# Altium footprint library STM32F0.PcbLib: 228 footprints (part 11 of 16)
Each footprint in its own frame and in the unit in brackets; x right, y up, seen from the top. Pads: shape width x height; smd on the part's side, far side on the other; paste and mask are expansions set on the pad; w line width, h text height; cw(c..) or ccw(c..) is an arc to the next point about the centre after c.
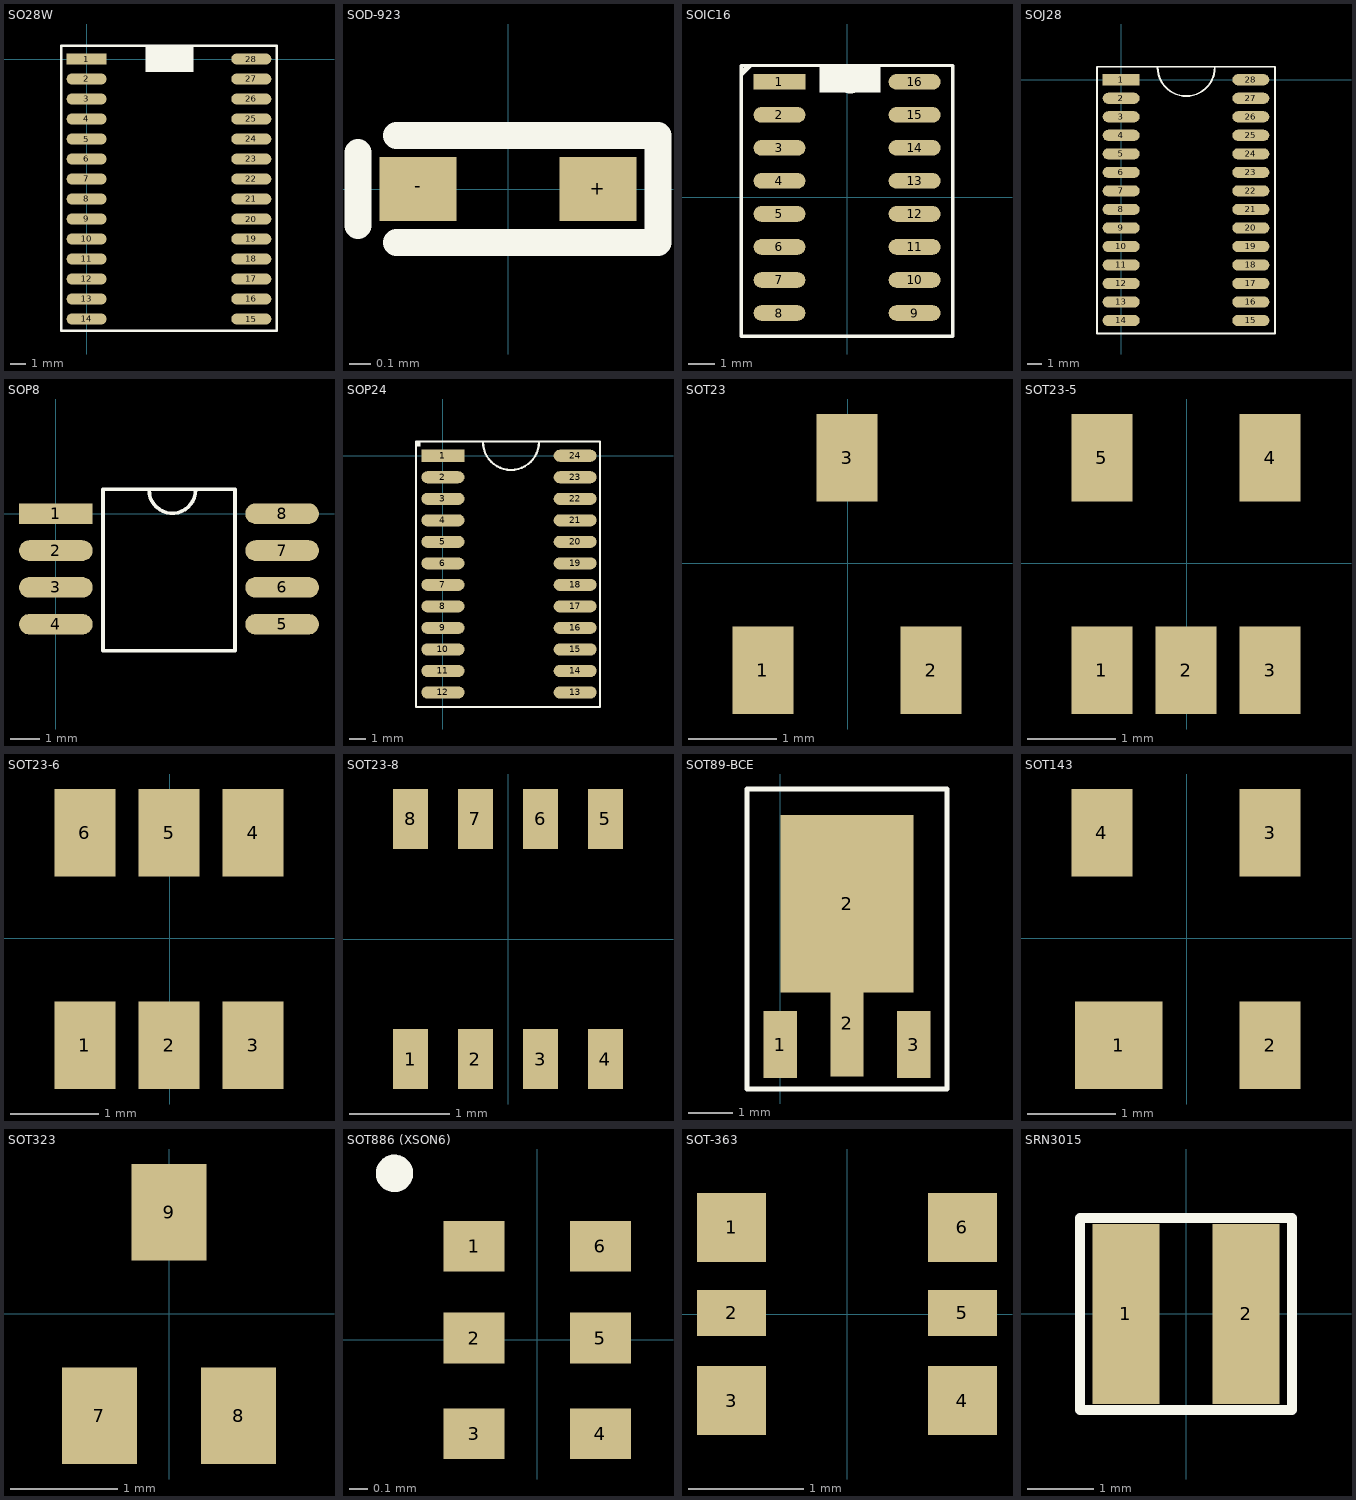
[diagram p10: the footprints below, top view; thin cyan lines are the x and y axes]

## SO28W [mil]
pads (28):
  rect 100x28 smd: 1(0,0)
  oval 100x28 smd: 2(0,-50) 3(0,-100) 4(0,-150) 5(0,-200) 6(0,-250) 7(0,-300) 8(0,-350) 9(0,-400) 10(0,-450) 11(0,-500) 12(0,-550) 13(0,-600) 14(0,-650) 15(411.81,-650) 16(411.81,-600) 17(411.81,-550) 18(411.81,-500) 19(411.81,-450) 20(411.81,-400) 21(411.81,-350) 22(411.81,-300) 23(411.81,-250) 24(411.81,-200) 25(411.81,-150) 26(411.81,-100) 27(411.81,-50) 28(411.81,0)
Top Overlay:
  rectangle: 146.65,-32.4 266.73,30
  lines w6: -63,-20 -63,-4 ; -63,-679 -63,33 475,33 475,-679 -63,-679
3D body: height 35, standoff 15, extent 18.5,-558 51,-543
3D body: height 20, standoff 0, extent 5,-558 32,-543
3D body: height 35, standoff 15, extent 361,-557 393.5,-542
3D body: height 20, standoff 0, extent 380,-557 407,-542
3D body: height 20, standoff 0, extent 380,-507 407,-492
3D body: height 35, standoff 15, extent 361,-507 393.5,-492
3D body: height 20, standoff 0, extent 5,-508 32,-493
3D body: height 35, standoff 15, extent 18.5,-508 51,-493
3D body: height 35, standoff 15, extent 18.5,-408 51,-393
3D body: height 20, standoff 0, extent 5,-408 32,-393
3D body: height 35, standoff 15, extent 361,-407 393.5,-392
3D body: height 20, standoff 0, extent 380,-407 407,-392
3D body: height 35, standoff 15, extent 18.5,-358 51,-343
3D body: height 20, standoff 0, extent 5,-358 32,-343
3D body: height 35, standoff 15, extent 361,-357 393.5,-342
3D body: height 20, standoff 0, extent 380,-357 407,-342
3D body: height 61, standoff 60, extent 140,-39 271,27
3D body: height 61, standoff 60, extent 68.08,-10.98 88,8.98
3D body: height 20, standoff 0, extent 380,-207 407,-192
3D body: height 35, standoff 15, extent 361,-207 393.5,-192
3D body: height 20, standoff 0, extent 380,-257 407,-242
3D body: height 35, standoff 15, extent 361,-257 393.5,-242
3D body: height 20, standoff 0, extent 380,-307 407,-292
3D body: height 35, standoff 15, extent 361,-307 393.5,-292
3D body: height 20, standoff 0, extent 5,-308 32,-293
3D body: height 35, standoff 15, extent 18.5,-308 51,-293
3D body: height 20, standoff 0, extent 5,-258 32,-243
3D body: height 35, standoff 15, extent 18.5,-258 51,-243
3D body: height 35, standoff 15, extent 18.5,-208 51,-193
3D body: height 20, standoff 0, extent 5,-208 32,-193
3D body: height 20, standoff 0, extent 380,-7 407,8
3D body: height 35, standoff 15, extent 361,-7 393.5,8
3D body: height 20, standoff 0, extent 380,-57 407,-42
3D body: height 35, standoff 15, extent 361,-57 393.5,-42
3D body: height 20, standoff 0, extent 380,-107 407,-92
3D body: height 35, standoff 15, extent 361,-107 393.5,-92
3D body: height 20, standoff 0, extent 380,-157 407,-142
3D body: height 35, standoff 15, extent 361,-157 393.5,-142
3D body: height 20, standoff 0, extent 5,-158 32,-143
3D body: height 35, standoff 15, extent 18.5,-158 51,-143
3D body: height 20, standoff 0, extent 5,-108 32,-93
3D body: height 35, standoff 15, extent 18.5,-108 51,-93
3D body: height 20, standoff 0, extent 5,-58 32,-43
3D body: height 35, standoff 15, extent 18.5,-58 51,-43
3D body: height 35, standoff 15, extent 18.5,-8 51,7
3D body: height 20, standoff 0, extent 5,-8 32,7
3D body: height 60, standoff 10, extent 50,-675 362,25
3D body: height 20, standoff 0, extent 380,-457 407,-442
3D body: height 35, standoff 15, extent 361,-457 393.5,-442
3D body: height 20, standoff 0, extent 5,-458 32,-443
3D body: height 35, standoff 15, extent 18.5,-458 51,-443
3D body: height 35, standoff 15, extent 18.5,-608 51,-593
3D body: height 20, standoff 0, extent 5,-608 32,-593
3D body: height 35, standoff 15, extent 361,-607 393.5,-592
3D body: height 20, standoff 0, extent 380,-607 407,-592
3D body: height 20, standoff 0, extent 380,-657 407,-642
3D body: height 35, standoff 15, extent 361,-657 393.5,-642
3D body: height 20, standoff 0, extent 5,-658 32,-643
3D body: height 35, standoff 15, extent 18.5,-658 51,-643

## SOD-923 [mm]
pads (2):
  rect 0.36x0.3 smd: +(0.42,0) -(-0.42,0)
Top Overlay:
  lines w0.125: -0.7,-0.17 -0.7,0.17 ; -0.52,-0.25 0.7,-0.25 0.7,0.25 -0.52,0.25
3D body "User Library-DIODE_SOD-923.step": height 0.43, standoff 0, extent -0.525,-0.325 0.525,0.325

## SOIC16 [mm]
pads (16):
  rect 2x0.6 smd: 1(-2.6,4.445)
  oval 2x0.6 smd: 2(-2.6,3.175) 3(-2.6,1.905) 4(-2.6,0.635) 5(-2.6,-0.635) 6(-2.6,-1.905) 7(-2.6,-3.175) 8(-2.6,-4.445) 9(2.6,-4.445) 10(2.6,-3.175) 11(2.6,-1.905) 12(2.6,-0.635) 13(2.6,0.635) 14(2.6,1.905) 15(2.6,3.175) 16(2.6,4.445)
Top Overlay:
  rectangle: -1.069,4.045 1.281,5.08
  lines w0.127: -3.686,5.08 -4.067,4.699 -4.067,4.826 -3.813,5.08 -4.067,5.08 ; -0.892,5.08 ccw(c0.124,5.08) 1.14,5.08 ; -4.067,5.08 -4.067,-5.334 4.061,-5.334 4.061,5.08 -4.067,5.08
3D body: height 0.89, standoff 0.38, extent -2.959,-4.648 -2.134,-4.267
3D body: height 0.51, standoff 0, extent -3.302,-4.648 -2.616,-4.267
3D body: height 0.89, standoff 0.38, extent 2.134,-4.623 2.959,-4.242
3D body: height 0.51, standoff 0, extent 2.616,-4.623 3.302,-4.242
3D body: height 1.55, standoff 1.52, extent -1.067,4.14 1.067,5.004
3D body: height 1.55, standoff 1.52, extent -1.88,4.216 -1.374,4.723
3D body: height 0.51, standoff 0, extent 2.616,-0.813 3.302,-0.432
3D body: height 0.89, standoff 0.38, extent 2.134,-0.813 2.959,-0.432
3D body: height 0.51, standoff 0, extent 2.616,-2.083 3.302,-1.702
3D body: height 0.89, standoff 0.38, extent 2.134,-2.083 2.959,-1.702
3D body: height 0.51, standoff 0, extent 2.616,-3.353 3.302,-2.972
3D body: height 0.89, standoff 0.38, extent 2.134,-3.353 2.959,-2.972
3D body: height 0.51, standoff 0, extent -3.302,-3.378 -2.616,-2.997
3D body: height 0.89, standoff 0.38, extent -2.959,-3.378 -2.134,-2.997
3D body: height 0.51, standoff 0, extent -3.302,-2.108 -2.616,-1.727
3D body: height 0.89, standoff 0.38, extent -2.959,-2.108 -2.134,-1.727
3D body: height 0.89, standoff 0.38, extent -2.959,-0.838 -2.134,-0.457
3D body: height 0.51, standoff 0, extent -3.302,-0.838 -2.616,-0.457
3D body: height 0.51, standoff 0, extent 2.616,4.267 3.302,4.648
3D body: height 0.89, standoff 0.38, extent 2.134,4.267 2.959,4.648
3D body: height 0.51, standoff 0, extent 2.616,2.997 3.302,3.378
3D body: height 0.89, standoff 0.38, extent 2.134,2.997 2.959,3.378
3D body: height 0.51, standoff 0, extent 2.616,1.727 3.302,2.108
3D body: height 0.89, standoff 0.38, extent 2.134,1.727 2.959,2.108
3D body: height 0.51, standoff 0, extent 2.616,0.457 3.302,0.838
3D body: height 0.89, standoff 0.38, extent 2.134,0.457 2.959,0.838
3D body: height 0.51, standoff 0, extent -3.302,0.432 -2.616,0.813
3D body: height 0.89, standoff 0.38, extent -2.959,0.432 -2.134,0.813
3D body: height 0.51, standoff 0, extent -3.302,1.702 -2.616,2.083
3D body: height 0.89, standoff 0.38, extent -2.959,1.702 -2.134,2.083
3D body: height 0.51, standoff 0, extent -3.302,2.972 -2.616,3.353
3D body: height 0.89, standoff 0.38, extent -2.959,2.972 -2.134,3.353
3D body: height 0.89, standoff 0.38, extent -2.959,4.242 -2.134,4.623
3D body: height 0.51, standoff 0, extent -3.302,4.242 -2.616,4.623
3D body: height 1.52, standoff 0.25, extent -2.159,-5.334 2.159,5.08

## SOJ28 [mil]
pads (28):
  rect 100x30 smd: 1(0,0)
  oval 100x30 smd: 2(0,-50) 3(0,-100) 4(0,-150) 5(0,-200) 6(0,-250) 7(0,-300) 8(0,-350) 9(0,-400) 10(0,-450) 11(0,-500) 12(0,-550) 13(0,-600) 14(0,-650) 15(350,-650) 16(350,-600) 17(350,-550) 18(350,-500) 19(350,-450) 20(350,-400) 21(350,-350) 22(350,-300) 23(350,-250) 24(350,-200) 25(350,-150) 26(350,-100) 27(350,-50) 28(350,0)
Top Overlay:
  lines w5: 98.48,33 ccw(c175.5,33) 252.51,33 ; 160,35 415,35 415,-685 -65,-685 -65,35 162.5,35

## SOP8 [mil]
pads (8):
  rect 100x28 smd: 1(0,0)
  oval 100x28 smd: 2(0,-50) 3(0,-100) 4(0,-150) 5(307,-150) 6(307,-100) 7(307,-50) 8(307,0)
Top Overlay:
  lines w5: 126.5,32 ccw(c158,32) 189.5,32 ; 63.98,-186.02 243.11,-186.02 243.11,33 63.98,33 63.98,-186.02

## SOP24 [mil]
pads (24):
  rect 100x28 smd: 1(0,0)
  oval 100x28 smd: 2(0,-50) 3(0,-100) 4(0,-150) 5(0,-200) 6(0,-250) 7(0,-300) 8(0,-350) 9(0,-400) 10(0,-450) 11(0,-500) 12(0,-550) 13(307,-550) 14(307,-500) 15(307,-450) 16(307,-400) 17(307,-350) 18(307,-300) 19(307,-250) 20(307,-200) 21(307,-150) 22(307,-100) 23(307,-50) 24(307,0)
Top Overlay:
  rectangle: -63,21 -52,33
  lines w5: -63,-20 -63,-4 ; 93,32 ccw(c158,32) 223,32 ; 364,-584 -63,-584 -63,33 365,33 ; 365.19,-584 365.19,33

## SOT23 [mm]
pads (3):
  rect 0.69x0.99 smd: 1(-0.96,-1.21) 2(0.94,-1.21) 3(-0.01,1.19)

## SOT23-5 [mm]
pads (5):
  rect 0.69x0.99 smd: 1(-0.96,-1.21) 2(-0.01,-1.21) 3(0.94,-1.21) 4(0.94,1.19) 5(-0.96,1.19)
3D body "User Library-SOT23-5.STEP": height 1.1, standoff 0, extent -1.45,-1.42 1.45,1.38

## SOT23-6 [mm]
pads (6):
  rect 0.69x0.99 smd: 1(-0.96,-1.21) 2(-0.01,-1.21) 3(0.94,-1.21) 4(0.94,1.19) 5(-0.01,1.19) 6(-0.96,1.19)
3D body "User Library-MO-178C.step": height 1.45, standoff 0, extent -1.45,-1.405 1.45,1.405

## SOT23-8 [mm]
pads (8):
  rect 0.35x0.6 smd: 1(-0.975,-1.2) 2(-0.325,-1.2) 3(0.325,-1.2) 4(0.975,-1.2) 5(0.975,1.2) 6(0.325,1.2) 7(-0.325,1.2) 8(-0.975,1.2)
3D body "User Library-sot238.step": height 1.2, standoff 0, extent -1.45,-1.4 1.49,1.4

## SOT89-BCE [mm]
pads (4):
  rect 0.75x1.5 smd: 1(0,1.5) 3(3,1.5)
  rect 0.75x2.4 smd: 2(1.5,1.983)
  rect 3x4 smd: 2(1.5,4.67)
Top Overlay:
  lines w0.102: -0.75,0.5 -0.75,7.25 3.75,7.25 3.75,0.5 -0.75,0.5
3D body: height 0.51, standoff 0, extent 0.33,5.207 2.692,6.325
3D body: height 1.3, standoff 1.27, extent -0.254,2.896 0.252,3.403
3D body: height 0.64, standoff 0, extent 2.743,1.524 3.251,2.667
3D body: height 0.64, standoff 0, extent 1.245,1.524 1.753,2.667
3D body: height 1.27, standoff 0, extent -0.508,2.667 3.556,5.207
3D body: height 0.64, standoff 0, extent -0.254,1.524 0.254,2.667

## SOT143 [mm]
pads (4):
  rect 0.99x0.99 smd: 1(-0.771,-1.211)
  rect 0.69x0.99 smd: 2(0.94,-1.21) 3(0.94,1.19) 4(-0.96,1.19)
3D body "User Library-sot143.step": height 1, standoff 0, extent -1.46,-1.22 1.46,1.2

## SOT323 [mm]
pads (3):
  rect 0.7x0.9 smd: 7(-0.65,-0.95) 8(0.65,-0.95) 9(0,0.95)

## SOT886 (XSON6) [mm]
pads (6):
  rect 0.325x0.27 smd: 1(-0.337,0.5) 2(-0.337,0.01) 3(-0.337,-0.5) 4(0.337,-0.5) 5(0.337,0.01) 6(0.337,0.5)
Top Overlay:
  circle w0.1: c-0.762,0.889 r0.05
3D body "User Library-SOT886 (XSON6).step": height 0.46, standoff -0.04, extent -0.525,-0.75 0.525,0.75

## SOT-363 [mm]
pads (6):
  rect 0.6x0.6 smd: 1(-1,0.75) 3(-1,-0.75) 4(1,-0.75) 6(1,0.75)
  rect 0.6x0.4 smd: 2(-1,0.01) 5(1,0.01)
3D body "User Library-sot363.step": height 1, standoff 0, extent -1.15,-1.05 1.15,1.05

## SRN3015 [mm]
pads (2):
  rect 1x2.7 smd: 1(-0.9,0) 2(0.9,0)
Top Overlay:
  lines w0.15: -1.59,-1.44 1.59,-1.44 1.59,1.44 -1.59,1.44 -1.59,-1.44
3D body "User Library-Inductor SRN3015 Series.step": height 1.5, standoff 0, extent -1.51,-1.362 1.51,1.362